# Altium schematic symbol library Semi-ATE.SchLib: 322 symbols (part 3 of 6) (continued)
## K20P144_2 (continued)
IC MCU 32BIT 512KB FLASH 144BGA; MFR-PN: MK20DN512VMD10; MFR: FREESCALE; 04. Manufacturer: NXP USA Inc.; POPULATED: yes; 03. Unit Price: 10.27; 3D-Export: No; 01. Distributor: DigiKey; 02. Distributor Part Number: MK20DN512VMD10-ND; 07. Manufacturer  Part Number: MK20DN512VMD10; 09. Operating Temperature: -40°C ~ 105°C (TA); 11. RoHS: YES; ComponentLink4Description: Info; ComponentLink4URL: https://www.digikey.de/products/en?keywords=MK20DN512VMD10; ComponentLink5Description: DataSheet; ComponentLink5URL: http://cache.freescale.com/files/32bit/doc/data_sheet/K20P144M100SF2V2.pdf
footprint MAPBGA144 (NXP BGA, 144-Leads, Body 13.00x13.00mmx1.70mm, Pitch 1.00mm (Document No: 98ASA00222D))
part A pins: A10 VDD/NC, B10 VDD/NC, C10 VSS/NC, E5 VDD (power), E6 VDD (power), E7 VDD (power), E8 VDD (power), F5 VDD (power), F6 VSS (power), F7 VSS (power), F8 VDD (power), G1 VOUT33, G2 VREGIN (in), G5 VREFH (power), G6 VREFL (power), G7 VSS (power), G8 VSS (power), H3 VSS (power), H5 VDDA (power), H6 VSSA (power), H7 VSS (power), H8 VSS (power), L5 RTC_WAKEUP_B, L6 VBAT (power), L12 nReset, M3 VREF-OUT, M5 VSS/NC, M6 EXTAL32 (in), M7 XTAL32 (out), M10 VSS (power)
part B pins: H1 USB-DP (hiz), H2 USB-DM (hiz), J1 ADC0-DP1 (in), J2 ADC0-DM1 (in), J3 ADC0-SE16 (in), K1 ADC1-DP1 (in), K2 ADC1-DM1 (in), K3 ADC1-SE16 (in), L1 ADC0-DP0 (in), L2 ADC0-DM0 (in), L3 DAC0-OUT (out), L4 DAC1-OUT (out), M1 ADC1-DP0 (in), M2 ADC1-DM0 (in)
part C pins: H11 PTA29 (hiz), H12 PTA28 (hiz), J5 PTA0 (hiz), J6 PTA1 (hiz), J7 PTA6 (hiz), J8 PTA7 (hiz), J9 PTA13 (hiz), J10 PTA27 (hiz), J11 PTA26 (hiz), J12 PTA25 (hiz), K6 PTA2 (hiz), K7 PTA3 (hiz), K8 PTA8 (hiz), K9 PTA12 (hiz), K10 PTA16 (hiz), K11 PTA17 (hiz), K12 PTA24 (hiz), L7 PTA4 (hiz), L8 PTA9 (hiz), L9 PTA11 (hiz), L10 PTA14 (hiz), L11 PTA15 (hiz), M8 PTA5 (hiz), M9 PTA10 (hiz), M11 PTA19 (io), M12 PTA18 (io)
part D pins: C11 PTB23 (hiz), C12 PTB22 (hiz), D9 PTB21 (hiz), D10 PTB20 (hiz), D11 PTB19 (hiz), D12 PTB18 (hiz), E9 PTB17 (hiz), E10 PTB16 (hiz), E11 PTB11 (hiz), E12 PTB10 (hiz), F9 PTB9 (hiz), F10 PTB8 (hiz), F11 PTB7 (hiz), F12 PTB6 (hiz), G9 PTB5 (hiz), G10 PTB4 (hiz), G11 PTB3 (hiz), G12 PTB2 (hiz), H9 PTB1 (hiz), H10 PTB0 (hiz)
part E pins: A6 PTC16 (hiz), A7 PTC12 (hiz), A8 PTC8 (hiz), A9 PTC4 (hiz), A11 PTC3 (hiz), A12 PTC2 (hiz), B5 PTC19 (hiz), B6 PTC15 (hiz), B7 PTC11 (hiz), B8 PTC7 (hiz), B11 PTC1 (hiz), B12 PTC0 (hiz), C5 PTC18 (hiz), C6 PTC14 (hiz), C7 PTC10 (hiz), C8 PTC6 (hiz), D5 PTC17 (hiz), D6 PTC13 (hiz), D7 PTC9 (hiz), D8 PTC5 (hiz)
part F pins: A1 PTD7 (hiz), A2 PTD6 (hiz), A3 PTD5 (hiz), A4 PTD4 (hiz), A5 PTD0 (hiz), B1 PTD12 (hiz), B2 PTD11 (hiz), B3 PTD10 (hiz), B4 PTD3 (hiz), B9 PTD9 (hiz), C1 PTD15 (hiz), C2 PTD14 (hiz), C3 PTD13 (hiz), C4 PTD2 (hiz), C9 PTD8 (hiz), D4 PTD1 (hiz)
part G pins: D1 PTE2 (hiz), D2 PTE1 (hiz), D3 PTE0 (hiz), E1 PTE6 (hiz), E2 PTE5 (hiz), E3 PTE4 (hiz), E4 PTE3 (hiz), F1 PTE10 (hiz), F2 PTE9 (hiz), F3 PTE8 (hiz), F4 PTE7 (hiz), G3 PTE12 (hiz), G4 PTE11 (hiz), H4 PTE28 (hiz), J4 PTE27 (hiz), K4 PTE26 (hiz), K5 PTE25 (hiz), M4 PTE24 (hiz)

## L
designator L?  (value not drawn)
DC Resistance: 15mΩ; 13. Created Date/Name: AUG2018/Hören; ComponentLink1Description: Info; ComponentLink2Description: DataSheet; 09. Operating Temperature: -55°C ~ 125°C; 11. RoHS: YES; 01. Distributor: DigiKey; Value: ?
footprint FB0805
footprint FB1206 (SMT Ferrite Bead 1206)
footprint L1206
pins: 1, 2

## LED
designator D?, comment 07. Manufacturer  Part Number: LTST-C170GKT  (hidden comment: D)
LED GREEN CLEAR SMD; 04. Manufacturer: Lite-On Inc.; POPULATED: yes; 03. Unit Price: 0.29; 3D-Export: No; 01. Distributor: DigiKey; 02. Distributor Part Number: 160-1179-6-ND; 11. RoHS: YES; ComponentLink4Description: Info; ComponentLink4URL: https://www.digikey.de/products/en/optoelectronics/led-indication-discrete/105?k=LTST-C170GKT&k=&pkeyword=LTST-C170GKT&sv=0&pv7=243&sf=0&quantity=&ColumnSort=0&page=1&pageSize=25; ComponentLink5Description: DataSheet; ComponentLink5URL: https://media.digikey.com/pdf/Data%20Sheets/Lite-On%20PDFs/LTST-C170GKT.pdf
footprint SMD 0.8x0.8 (Footprint not found)
footprint LED0603
pins: 1 A, 2 K

## LP5907MFX-1.8/NOPB
designator U?, comment U  (value not drawn)
IC REG LINEAR 1.8V 250MA SOT23-5; 04. Manufacturer: Texas Instruments; 07. Manufacturer  Part Number: LP5907MFX-1.8/NOPB; 03. Unit Price: 0.45; 13. Created Date/Name: AUG 2018 / Hören; 3D-Export: No; 01. Distributor: DigiKey; 02. Distributor Part Number: 296-41463-6-ND; 09. Operating Temperature: -40°C ~ 125°C; 11. RoHS: YES; ComponentLink1Description: Info; ComponentLink1URL: https://www.digikey.de/product-detail/en/texas-instruments/LP5907MFX-1-8-NOPB/296-41463-6-ND/5223076; ComponentLink2Description: DataSheet; ComponentLink2URL: https://www.ti.com/lit/ds/symlink/lp5907.pdf?HQS=TI-null-null-digikeymode-df-pf-null-wwe&ts=1600441289836; Package: SOT23-5
footprint SOT23-5 (SOT 23 5 lead)
pins: 1 IN, 2 GND, 3 EN, 4 N/C, 5 OUT

## LT1720
designator U?, comment NicName: LT1720  (hidden comment: U)
IC COMP R-RINOUT DUAL 8-SOIC; 04. Manufacturer: Linear Technology/Analog Devices; 07. Manufacturer  Part Number: LT1720IS8#TRPBF; 03. Unit Price: 7.15; 13. Created Date/Name: AUG 2018 / Hören; Design: AWGDIG; 3D-Export: No; 01. Distributor: DigiKey; 02. Distributor Part Number: LT1720IS8#TRPBFDKR-ND; 09. Operating Temperature: -40°C ~ 85°C; 11. RoHS: YES; ComponentLink1Description: Info; ComponentLink1URL: https://www.digikey.de/products/en/integrated-circuits-ics/linear-comparators/692?k=LT1720&k=&pkeyword=LT1720&pv7=243&sf=0&quantity=&ColumnSort=0&page=1&pageSize=25; ComponentLink2Description: DataSheet; ComponentLink2URL: https://www.analog.com/media/en/technical-documentation/data-sheets/17201fc.pdf
footprint SOIC8 (R-8) (Generic 8 lead SOIC Narrow Body)
part A pins: 1 +, 2 -, 7 OUTA
part B pins: 3 -, 4 +, 6 OUTB
part C pins: 5 GND, 8 VCC

## LT6654
designator U?, comment NicName: LT6654  (hidden comment: U)
IC VREF SERIES 1.25V TSOT23-6; 04. Manufacturer: Linear Technology/Analog Devices; 07. Manufacturer  Part Number: LT6654AMPS6-1.25#TRMPBF; 03. Unit Price: 14.36; 13. Created Date/Name: AUG 2018 / Hören; Design: AWGDIG; 3D-Export: No; 01. Distributor: DigiKey; 02. Distributor Part Number: LT6654AMPS6-1.25#TRMPBFDKR-ND; 09. Operating Temperature: -55°C ~ 125°C; 11. RoHS: YES; ComponentLink1Description: Info; ComponentLink1URL: https://www.digikey.de/product-detail/en/linear-technology-analog-devices/LT6654AMPS6-1.25-TRMPBF/LT6654AMPS6-1.25-TRMPBFDKR-ND/5119215; ComponentLink2Description: DataSheet; ComponentLink2URL: https://www.analog.com/media/en/technical-documentation/data-sheets/6654fh.pdf
footprint TSOT23-6(S6) (6-Lead Plastic TSOT-23)
pins: 1 GND, 2 GND, 4 Vin, 6 Vout

## LTC1992-1
designator U?, comment U
IC OPAMP DIFF 3.2MHZ RRO 8MSOP; 04. Manufacturer: Linear Technology/Analog Devices; 07. Manufacturer  Part Number: LTC1992-1HMS8#PBF; 03. Unit Price: 8.85; 13. Created Date/Name: AUG 2018 / Hören; NicName: LTC1992; Design: AWGDIG; 3D-Export: No; ComponentLink1Description: Info; ComponentLink2Description: DataSheet; ComponentLink1URL: https://www.digikey.de/products/en?keywords=LTC1992-1HMS8%23PBF; ComponentLink2URL: http://cds.linear.com/docs/en/datasheet/1992fb.pdf; 01. Distributor: DigiKey; 02. Distributor Part Number: LTC1992-1HMS8#PBF-ND; 09. Operating Temperature: -40°C ~ 125°C; 11. RoHS: YES
footprint MSOP8(RM-8) (8-Lead MSOP)
part A pins: 3 +Vs, 6 -Vs, 7 Vmid
part B pins: 1 -IN, 2 Vcom, 4 +OUT, 5 -OUT, 8 +IN
part B text: 30K; +; -

## LTC3646-1
designator U?, comment NicName: LTC3646-1  (hidden comment: U)
IC REG BUCK ADJ 1A SYNC 14DFN; MFR-PN: LTC3646EDE-1#PBF; MFR: LINEAR; 04. Manufacturer: Linear Technology/Analog Devices; POPULATED: yes; 03. Unit Price: 6.13; 3D-Export: No; 01. Distributor: DigiKey; 02. Distributor Part Number: LTC3646EDE-1#PBF-ND; 07. Manufacturer  Part Number: LTC3646EDE-1#PBF; 09. Operating Temperature: -40°C ~ 150°C (TJ); 11. RoHS: YES; ComponentLink1Description: Info; ComponentLink1URL: https://www.digikey.de/products/en?keywords=LTC3646EDE-1%23PBF; ComponentLink2Description: DataSheet; ComponentLink2URL: http://www.linear.com/docs/42459
footprint DE14
pins: 1 SGND (power), 2 VFB (in), 3 ITH (out), 4 RT (in), 5 VON (in), 6 PGOOD (out), 7 MODE/SYNC (in), 8 PVIN (in), 9 SW (hiz), 10 BOOST (in), 11 INTVCC (out), 12 EXTVCC (in), 13 RUN (in), 14 SVIN (in), 15 PGND (E.P.) (power)

## LTC4229
designator U?, comment NicName: LTC4229  (hidden comment: U)
IC HOT SWAP CONTROL DUAL 24QFN; MFR-PN: LTC4229IUFD#PBF; MFR: LINEAR; 04. Manufacturer: Linear Technology/Analog Devices; POPULATED: yes; 03. Unit Price: 6.99; 3D-Export: No; 01. Distributor: DigiKey; 02. Distributor Part Number: LTC4229IUFD#PBF-ND; 07. Manufacturer  Part Number: LTC4229IUFD#PBF; 09. Operating Temperature: -40°C ~ 85°C; 11. RoHS: YES; ComponentLink4Description: Info; ComponentLink4URL: https://www.digikey.de/products/en?keywords=LTC4229IUFD%23PBF; ComponentLink5Description: DataSheet; ComponentLink5URL: http://www.linear.com/docs/43671
footprint LT-UFD24-4mmx5mm (Footprint not found)
pins: 1 DSRC (in), 2 SENSE- (in), 3 SENSE+ (in), 4 IN (power), 5 DSNS (in), 6 INTVCC (out), 7 GND (power), 8 DTMR (in), 9 RTMR (in), 10 FTMR (out), 11 nEN (in), 12 UV (in), 13 OV (in), 14 DCFG (in), 15 DOFF (in), 16 nDFLT (hiz), 17 nDSTAT (oc), 18 nFAULT (hiz), 19 nPWRGD (hiz), 20 FB (in), 21 OUT (in), 22 HGATE (out), 23 CPO (out), 24 DGATE (out), 25 E.P.(GND) (power)

## LTM4630
designator U?, comment NicName: LTM4630  (hidden comment: U)
DC DC CNVRTR 0.6-1.8V 0.6-1.8V; MFR-PN: LTM4630EY#PBF; MFR: LINEAR TECHNOLOGY; 04. Manufacturer: Linear Technology/Analog Devices; STUFFED: yes; 03. Unit Price: 55.80; 3D-Export: No; 01. Distributor: DigiKey; 02. Distributor Part Number: LTM4630EY#PBF-ND; 07. Manufacturer  Part Number: LTM4630EY#PBF; 09. Operating Temperature: -40°C ~ 125°C; 11. RoHS: YES; ComponentLink4Description: Info; ComponentLink4URL: https://www.digikey.de/products/en?keywords=LTM4630EY%23PBF; ComponentLink5Description: DataSheet; ComponentLink5URL: https://www.analog.com/media/en/technical-documentation/data-sheets/4630fa.pdf
footprint LTM4630 (Footprint not found)
part A pins: A1 VOUT1 (power), A2 VOUT1 (power), A3 VOUT1 (power), A4 VOUT1 (power), A5 VOUT1 (power), A8 VOUT2 (power), A9 VOUT2 (power), A10 VOUT2 (power), A11 VOUT2 (power), A12 VOUT2 (power), B1 VOUT1 (power), B2 VOUT1 (power), B3 VOUT1 (power), B4 VOUT1 (power), B5 VOUT1 (power), B8 VOUT2 (power), B9 VOUT2 (power), B10 VOUT2 (power), B11 VOUT2 (power), B12 VOUT2 (power), C1 VOUT1 (power), C2 VOUT1 (power), C3 VOUT1 (power), C4 VOUT1 (power), C5 VOUTS1 (in), C6 FSET (in), C8 VOUTS2 (in), C9 VOUT2 (power), C10 VOUT2 (power), C11 VOUT2 (power), C12 VOUT2 (power), D5 VFB1 (in), D7 VFB2 (in), D8 TRACK2 (in), E5 TRACK1 (in), E6 COMP1 (in), E7 COMP2 (in), E8 DIFFP (in), E9 DIFFN (in), F4 MODE_PLLIN (in), F5 RUN1 (in), F8 DIFFOUT (out), F9 RUN2 (in), G2 SW1 (out), G4 PHASMD (in), G5 CLKOUT (out), G8 PGOOD2 (out), G9 PGOOD1 (out), G11 SW2 (out), H8 INTVCC (out), J6 TEMP
part B pins: A6 GND (power), A7 GND (power), B6 GND (power), B7 GND (power), C7 SGND (power), D1 GND (power), D2 GND (power), D3 GND (power), D4 GND (power), D6 SGND (power), D9 GND (power), D10 GND (power), D11 GND (power), D12 GND (power), E1 GND (power), E2 GND (power), E3 GND (power), E4 GND (power), E10 GND (power), E11 GND (power), E12 GND (power), F1 GND (power), F2 GND (power), F3 GND (power), F6 SGND (power), F7 SGND (power), F10 GND (power), F11 GND (power), F12 GND (power), G1 GND (power), G3 GND (power), G6 SGND (power), G7 SGND (power), G10 GND (power), G12 GND (power), H1 GND (power), H2 GND (power), H3 GND (power), H4 GND (power), H5 GND (power), H6 GND (power), H7 GND (power), H9 GND (power), H10 GND (power), H11 GND (power), H12 GND (power), J1 GND (power), J2 VIN (power), J3 VIN (power), J4 VIN (power), J5 GND (power), J7 EXTVCC (in), J8 GND (power), J9 VIN (power), J10 VIN (power), J11 VIN (power), J12 GND (power), K1 GND (power), K2 VIN (power), K3 VIN (power), K4 VIN (power), K5 GND (power), K6 GND (power), K7 GND (power), K8 GND (power), K9 VIN (power), K10 VIN (power), K11 VIN (power), K12 GND (power), L1 GND (power), L2 VIN (power), L3 VIN (power), L4 VIN (power), L5 VIN (power), L6 VIN (power), L7 VIN (power), L8 VIN (power), L9 VIN (power), L10 VIN (power), L11 VIN (power), L12 GND (power), M1 GND (power), M2 VIN (power), M3 VIN (power), M4 VIN (power), M5 VIN (power), M6 VIN (power), M7 VIN (power), M8 VIN (power), M9 VIN (power), M10 VIN (power), M11 VIN (power), M12 GND (power)

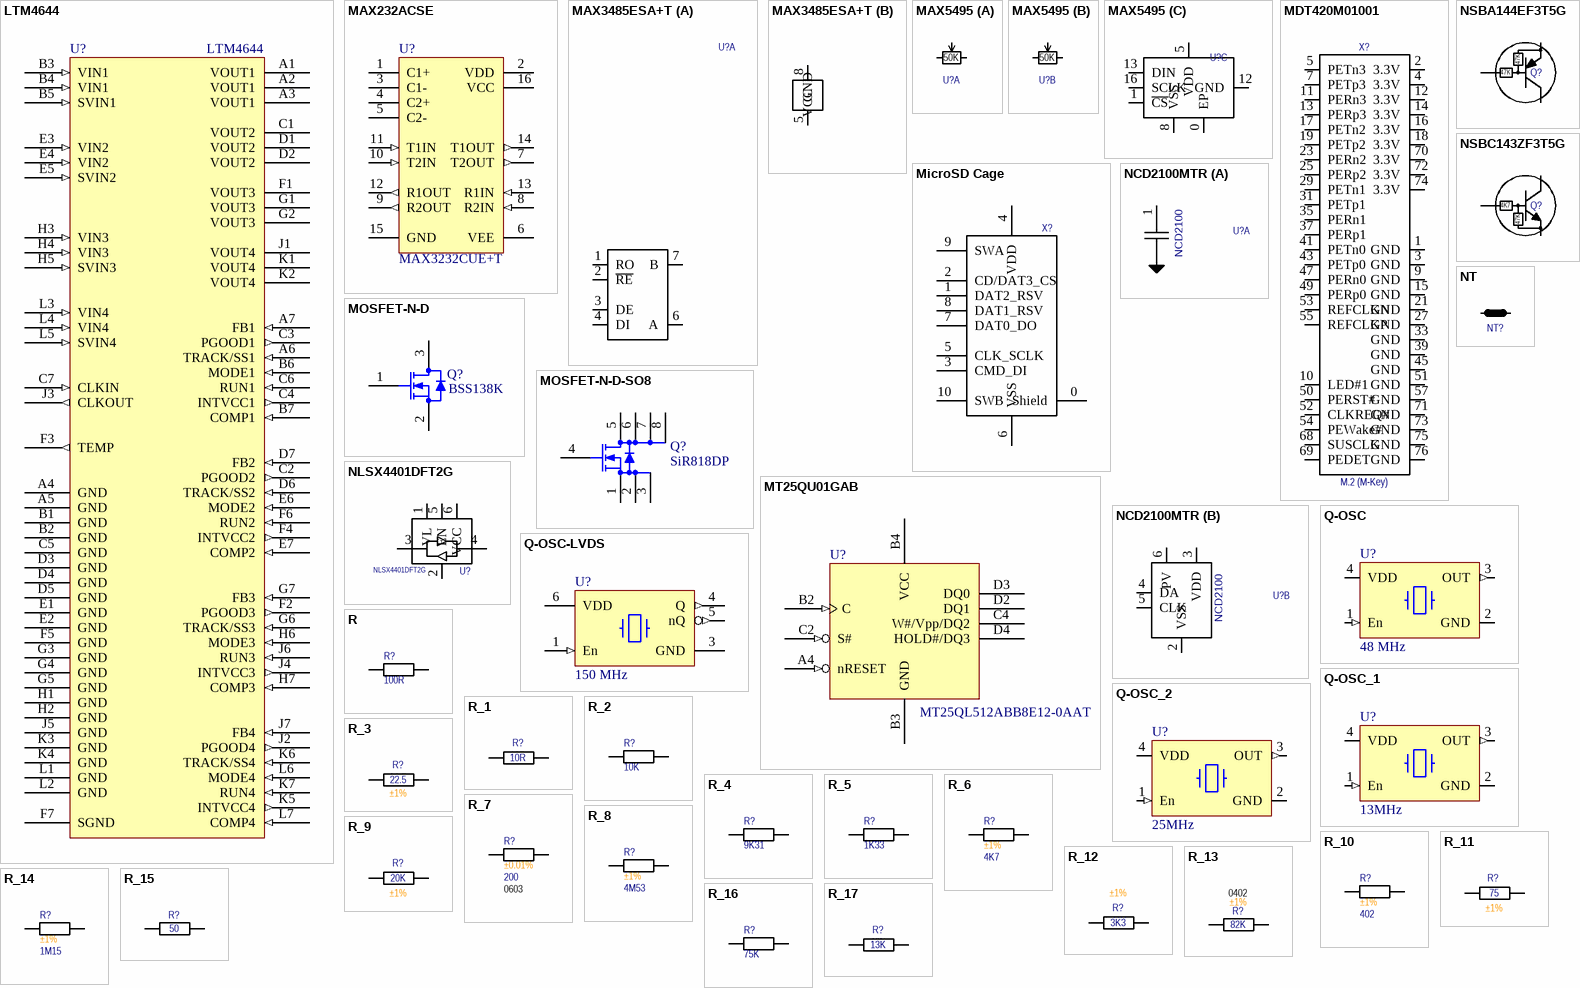
[diagram p10: symbols LTM4644 to R_17]

## LTM4644
designator U?, comment NicName: LTM4644  (hidden comment: U)
DC DC CONVERTER 4X0.6-5.5V; MFR-PN: LTM4644EY#PBF; MFR: LINEAR TECHNOLOGY; 04. Manufacturer: Linear Technology/Analog Devices; POPULATED: yes; 03. Unit Price: 39.30; 3D-Export: No; 01. Distributor: DigiKey; 02. Distributor Part Number: LTM4644EY#PBF-ND; 07. Manufacturer  Part Number: LTM4644EY#PBF; 09. Operating Temperature: -40°C ~ 125°C; 11. RoHS: YES; ComponentLink4Description: Info; ComponentLink4URL: https://www.digikey.de/products/en?keywords=LTM4644EY%23PBF; ComponentLink5Description: DataSheet; ComponentLink5URL: http://www.analog.com/media/en/technical-documentation/data-sheets/4644fe.pdf
footprint LTM4644 (Footprint not found)
pins: A1 VOUT1, A2 VOUT1, A3 VOUT1, A4 GND (power), A5 GND (power), A6 TRACK/SS1 (in), A7 FB1 (in), B1 GND (power), B2 GND (power), B3 VIN1 (in), B4 VIN1 (in), B5 SVIN1 (in), B6 MODE1 (in), B7 COMP1 (in), C1 VOUT2, C2 PGOOD2 (out), C3 PGOOD1 (out), C4 INTVCC1 (out), C5 GND (power), C6 RUN1 (in), C7 CLKIN (in), D1 VOUT2, D2 VOUT2, D3 GND (power), D4 GND (power), D5 GND (power), D6 TRACK/SS2 (in), D7 FB2 (in), E1 GND (power), E2 GND (power), E3 VIN2 (in), E4 VIN2 (in), E5 SVIN2 (in), E6 MODE2 (in), E7 COMP2 (in), F1 VOUT3, F2 PGOOD3 (out), F3 TEMP (out), F4 INTVCC2 (out), F5 GND (power), F6 RUN2 (in), F7 SGND (power), G1 VOUT3, G2 VOUT3, G3 GND (power), G4 GND (power), G5 GND (power), G6 TRACK/SS3 (in), G7 FB3 (in), H1 GND (power), H2 GND (power), H3 VIN3 (in), H4 VIN3 (in), H5 SVIN3 (in), H6 MODE3 (in), H7 COMP3 (in), J1 VOUT4, J2 PGOOD4 (out), J3 CLKOUT (out), J4 INTVCC3 (out), J5 GND (power), J6 RUN3 (in), J7 FB4 (in), K1 VOUT4, K2 VOUT4, K3 GND (power), K4 GND (power), K5 INTVCC4 (out), K6 TRACK/SS4 (in), K7 RUN4 (in), L1 GND (power), L2 GND (power), L3 VIN4 (in), L4 VIN4 (in), L5 SVIN4 (in), L6 MODE4 (in), L7 COMP4 (in)

## MAX232ACSE
designator U?, comment 07. Manufacturer  Part Number: MAX3232CUE+T  (hidden comment: U)
IC TXRX RS-232 LP 16-TSSOP; MFR-PN: MAX3232CUE+; MFR: Maxim; 04. Manufacturer: Maxim Integrated; POPULATED: yes; 03. Unit Price: 5.61; 3D-Export: No; 01. Distributor: DigiKey; 02. Distributor Part Number: MAX3232CUE+TDKR-ND; 09. Operating Temperature: 0°C ~ 70°C; 11. RoHS: YES; ComponentLink4Description: Info; ComponentLink4URL: https://www.digikey.de/products/en/integrated-circuits-ics/interface-drivers-receivers-transceivers/710?k=MAX3232CUE%2B&k=&pkeyword=MAX3232CUE%2B&sv=0&pv7=243&pv1989=0&sf=0&quantity=&ColumnSort=0&page=1&pageSize=25; ComponentLink5Description: DataSheet; ComponentLink5URL: https://datasheets.maximintegrated.com/en/ds/MAX3222-MAX3241.pdf
footprint TSSOP16
pins: 1 C1+, 2 VDD (power), 3 C1-, 4 C2+, 5 C2-, 6 VEE (power), 7 T2OUT (out), 8 R2IN (in), 9 R2OUT (out), 10 T2IN (in), 11 T1IN (in), 12 R1OUT (out), 13 R1IN (in), 14 T1OUT (out), 15 GND (power), 16 VCC (power)

## MAX3485ESA+T
designator U?, comment U  (value not drawn)
IC TRANSCEIVER FULL 1/1 8SOIC; 04. Manufacturer: Maxim Integrated; 07. Manufacturer  Part Number: MAX3490ESA+T; 03. Unit Price: 4.88; 05. Quantity: 1; 13. Created Date/Name: AUG 2018 / Hören; 3D-Export: No; 01. Distributor: Digi-Key; 02. Distributor Part Number: MAX3490ESA+TDKR-ND; 09. Operating Temperature: -40°C ~ 125°C; 11. RoHS: YES; ComponentLink1Description: Info; ComponentLink1URL: https://www.digikey.de/products/en?keywords=MAX3490ESA%2BTDKR-ND; ComponentLink2Description: DataSheet; ComponentLink2URL: https://datasheets.maximintegrated.com/en/ds/MAX3483-MAX3491.pdf; Package: SOIC8
footprint SOIC8 (R-8) (Generic 8 lead SOIC Narrow Body)
part A pins: 1 RO, 2 ~{RE}, 3 DE, 4 DI, 6 A, 7 B
part B pins: 5 GND, 8 VCC

## MAX5495
designator U?, comment U  (value not drawn)
IC DIG POT 10BIT 16TQFN; 04. Manufacturer: Maxim Integrated; 07. Manufacturer  Part Number: MAX5495ETE+T; 03. Unit Price: 7.63; 13. Created Date/Name: AUG 2018 / Hören; NicName: MAX5495; Design: AWGDIG; 3D-Export: No; 01. Distributor: DigiKey; 02. Distributor Part Number: MAX5495ETE+TDKR-ND; 09. Operating Temperature: -40°C ~ 85°C; 11. RoHS: YES; ComponentLink1Description: Info; ComponentLink1URL: https://www.digikey.de/products/en/integrated-circuits-ics/data-acquisition-digital-potentiometers/717?k=MAX5495&k=&pkeyword=MAX5495&pv7=243&sf=0&quantity=&ColumnSort=0&page=1&pageSize=25; ComponentLink2Description: DataSheet; ComponentLink2URL: https://datasheets.maximintegrated.com/en/ds/MAX5494-MAX5499.pdf; Package: 16WQFNE
footprint 16TQFN-EP (Maxim)
part A pins: 9 H1, 10 L1, 11 W1
part B pins: 2 W2, 3 L2, 4 H2
part C pins: 0 EP, 1 ~{CS}, 5 VDD, 8 VSS, 12 GND, 13 DIN, 16 SCLK
part A text: 50K
part B text: 50K

## MDT420M01001
designator X?, comment NicName: M.2 (M-Key)  (hidden comment: X)
M.2 M-Key; 04. Manufacturer: Amphenol ICC (Commercial Products); 07. Manufacturer  Part Number: MDT420M01001; 03. Unit Price: 1.82; 13. Created Date/Name: JUN2019/ Hören; System: Connector; 3D-Export: Yes; 01. Distributor: DigiKey; 02. Distributor Part Number: MDT420M01001DKR-ND; 09. Operating Temperature: -40°C ~ 80°C; 11. RoHS: YES; ComponentLink1Description: Info; ComponentLink1URL: https://www.digikey.de/product-detail/en/amphenol-icc-commercial-products/MDT420M01001/MDT420M01001DKR-ND/5810401; ComponentLink2Description: DataSheet; ComponentLink2URL: https://signin.amphenolcanada.com/ProductSearch/pdf/MDT_BRO.pdf; ComponentLink4Description: Signal Description; ComponentLink4URL: https://media.digikey.com/pdf/Data%20Sheets/Viking%20PDFs/PSFNP5zzzzDzzz.pdf; ComponentLink5Description: M.2 Card Lengths; ComponentLink5URL: https://www.delock.de/infothek/M.2/M.2_e.html
footprint MDT420M01001 (M.2 (M-Key) Amphenol)
pins: 1 GND, 2 3.3V, 3 GND, 4 3.3V, 5 PETn3, 7 PETp3, 9 GND, 10 LED#1, 11 PERn3, 12 3.3V, 13 PERp3, 14 3.3V, 15 GND, 16 3.3V, 17 PETn2, 18 3.3V, 19 PETp2, 21 GND, 23 PERn2, 25 PERp2, 27 GND, 29 PETn1, 31 PETp1, 33 GND, 35 PERn1, 37 PERp1, 39 GND, 41 PETn0, 43 PETp0, 45 GND, 47 PERn0, 49 PERp0, 50 PERST#, 51 GND, 52 CLKREQ#, 53 REFCLKN, 54 PEWake#, 55 REFCLKP, 57 GND, 68 SUSCLK, 69 PEDET, 70 3.3V, 71 GND, 72 3.3V, 73 GND, 74 3.3V, 75 GND, 76 GND

## MicroSD Cage
designator X?, comment X  (value not drawn)
CONN MICRO SD CARD PUSH-PUSH R/A; 04. Manufacturer: Molex; 07. Manufacturer  Part Number: 5025700893; 03. Unit Price: 3.52; 13. Created Date/Name: AUG 2018 / Hören; 3D-Export: Yes; ComponentLink1Description: Info; ComponentLink1URL: https://www.digikey.de/product-detail/en/molex/5025700893/WM19093DKR-ND/1866796; ComponentLink2Description: DataSheet; ComponentLink2URL: https://www.molex.com/pdm_docs/sd/5025700893_sd.pdf; 01. Distributor: DigiKey; 02. Distributor Part Number: WM19093DKR-ND; 09. Operating Temperature: -40°C/+85°C; 11. RoHS: YES
footprint 5025700893 (MicroSD Cage (Molex))
footprint 2201778-1 (MicroSD Cage (TE/AMP))
pins: 0 Shield, 1 DAT2_RSV, 2 CD/DAT3_CS, 3 CMD_DI, 4 VDD, 5 CLK_SCLK, 6 VSS, 7 DAT0_DO, 8 DAT1_RSV, 9 SWA, 10 SWB

## MOSFET-N-D
designator Q?, comment 07. Manufacturer  Part Number: BSS138K  (hidden comment: Q)
MOSFET N-CH 50V 220MA SOT-23-3; MFR: ONSEMI; 04. Manufacturer: ON Semiconductor; POPULATED: yes; 03. Unit Price: 0.36; 3D-Export: No; Revision: July-2002: Re-released for DXP Platform.; MFR-PN: BSS138K; 01. Distributor: DigiKey; 02. Distributor Part Number: BSS138KDKR-ND; 09. Operating Temperature: -55°C ~ 150°C (TJ); 11. RoHS: YES; ComponentLink4Description: Info; ComponentLink4URL: https://www.digikey.de/product-detail/en/on-semiconductor/BSS138K/BSS138KDKR-ND/2410068; ComponentLink5Description: DataSheet; ComponentLink5URL: https://www.onsemi.com/pub/Collateral/BSS138K-D.pdf
footprint SOT23 (Footprint not found)
pins: 1 G, 2 S, 3 D

## MOSFET-N-D-SO8
designator Q?, comment NicName: SiR818DP  (hidden comment: Q)
MOSFET N-CH 30V 50A PPAK SO-8; MFR: VISHAY; 04. Manufacturer: Vishay Siliconix; 07. Manufacturer  Part Number: SIR818DP-T1-GE3; POPULATED: yes; 03. Unit Price: 1.36; 3D-Export: No; Revision: July-2002: Re-released for DXP Platform.; MFR-PN: SiR818DP; 01. Distributor: DigiKey; 02. Distributor Part Number: SIR818DP-T1-GE3DKR-ND; 09. Operating Temperature: -55°C ~ 150°C (TJ); 11. RoHS: YES; ComponentLink4Description: Info; ComponentLink4URL: https://www.digikey.de/products/en/discrete-semiconductor-products/transistors-fets-mosfets-single/278?k=SiR818DP&k=&pkeyword=SiR818DP&sv=0&pv7=243&sf=0&quantity=&ColumnSort=0&page=1&pageSize=25; ComponentLink5Description: DataSheet; ComponentLink5URL: http://www.vishay.com/docs/67846/sir818dp.pdf
footprint SO8 (SOIC, 8-Leads, Body 4.9x3.9mm, Pitch 1.27mm, IPC High Density)
footprint PowerPak SO8
pins: 1 S, 2 S, 3 S, 4 G, 5 D, 6 D, 7 D, 8 D

## MT25QU01GAB
designator U?, comment 07. Manufacturer  Part Number: MT25QL512ABB8E12-0AAT  (hidden comment: U)
IC FLASH 512M SPI 24TPBGA; MFR: MICRON; 04. Manufacturer: Micron Technology Inc.; POPULATED: yes; 03. Unit Price: 8.64; 3D-Export: No; MFR-PN: MT25QL512ABB8E12-0AAT; Temperature Range: -40°C/+85°C; 01. Distributor: DigiKey; 02. Distributor Part Number: 557-1823-6-ND; 09. Operating Temperature: -40°C ~ 105°C (TA); 11. RoHS: YES; ComponentLink4Description: Info; ComponentLink4URL: https://www.digikey.de/products/en/integrated-circuits-ics/memory/774?k=MT25QL512ABB8E12-0AAT&k=&pkeyword=MT25QL512ABB8E12-0AAT&sv=0&pv7=243&sf=0&quantity=&ColumnSort=0&page=1&pageSize=25; ComponentLink5Description: DataSheet; ComponentLink5URL: https://www.micron.com/~/media/documents/products/data-sheet/nor-flash/serial-nor/mt25q/die-rev-b/mt25q_qlkt_l_512_abb_0.pdf
footprint T-PBGA24 (BGA100P9X9-81A)
pins: A4 nRESET (in), B2 C (in), B3 GND (power), B4 VCC (power), C2 S# (in), C4 W#/Vpp/DQ2 (hiz), D2 DQ1 (hiz), D3 DQ0 (hiz), D4 HOLD#/DQ3 (hiz)

## NCD2100MTR
designator U?, comment NickName: NCD2100  (hidden comment: U)
IC DIGITAL CAPACITOR 6DFN; 04. Manufacturer: IXYS Integrated Circuits Division; 07. Manufacturer  Part Number: NCD2100MTR; 03. Unit Price: 0.89; 01. Distributor: DigiKey; 02. Distributor Part Number: CLA4143-2-ND; 09. Operating Temperature: -20°C ~ +125°C; ComponentLink1Description: Info; ComponentLink1URL: https://www.digikey.de/product-detail/en/ixys-integrated-circuits-division/NCD2100MTR/CLA4143-2-ND/4918504?cur=EUR&lang=en; ComponentLink2Description: DataSheet; ComponentLink2URL: https://www.ixysic.com/home/pdfs.nsf/www/NCD2100.pdf/$file/NCD2100.pdf
footprint DFN6 (6-DFN)
part A pins: 1 X1
part B pins: 2 VSS, 3 VDD, 4 DA, 5 CLK (power), 6 PV (power)

## NLSX4401DFT2G
designator U?, comment 07. Manufacturer  Part Number: NLSX4401DFT2G  (hidden comment: U)
IC TRANSLATOR BIDIR SC70-6; 04. Manufacturer: ON Semiconductor; 03. Unit Price: 0.12; 13. Created Date/Name: AUG 2018 / Hören; 3D-Export: No; 01. Distributor: DigiKey; 02. Distributor Part Number: NLSX4401DFT2G-ND; 09. Operating Temperature: -40°C ~ 125°C; 11. RoHS: YES; ComponentLink1Description: Info; ComponentLink1URL: https://www.digikey.de/products/en/integrated-circuits-ics/logic-translators-level-shifters/732?k=&pkeyword=&sv=0&pv1914=r1.65V+%7E+5.5V&sf=1&FV=-8%7C732%2C1915%7C331587&quantity=&ColumnSort=0&page=1&pageSize=25; ComponentLink2Description: DataSheet; ComponentLink2URL: https://www.onsemi.com/pub/Collateral/NLSX4401DFT2G-D.PDF; Package: SC70-6
footprint SC70-6
pins: 1 VL, 2 GND, 3 IOVL, 4 IOVCC, 5 EN, 6 VCC

## NSBA144EF3T5G
designator Q?, comment Q  (value not drawn)
TRANS PREBIAS PNP 254MW SOT1123; 04. Manufacturer: ON Semiconductor; 07. Manufacturer  Part Number: NSBA144EF3T5G; 03. Unit Price: 0.05222; 05. Quantity: 8000; 13. Created Date/Name: AUG 2018 / Hören; Design: AWGDIG; 3D-Export: No; 01. Distributor: DigiKey; 02. Distributor Part Number: NSBA144EF3T5G-ND; 11. RoHS: YES; ComponentLink1Description: Info; ComponentLink1URL: https://www.digikey.de/products/en?keywords=NSBA144EF3T5G; ComponentLink2Description: DataSheet; ComponentLink2URL: https://www.onsemi.com/pub/Collateral/DTA144E-D.PDF; Package: SOT-1123
footprint SOT-1123
pins: 1 Base, 2 Emitter, 3 Collector
text: 47K

## NSBC143ZF3T5G
designator Q?, comment Q  (value not drawn)